# Altium footprint library ICs And Semiconductors SMD.PcbLib: 943 footprints (part 58 of 60)
Each footprint in its own frame and in the unit in brackets; x right, y up, seen from the top. Pads: shape width x height; smd on the part's side, far side on the other; paste and mask are expansions set on the pad; w line width, h text height; cw(c..) or ccw(c..) is an arc to the next point about the centre after c.
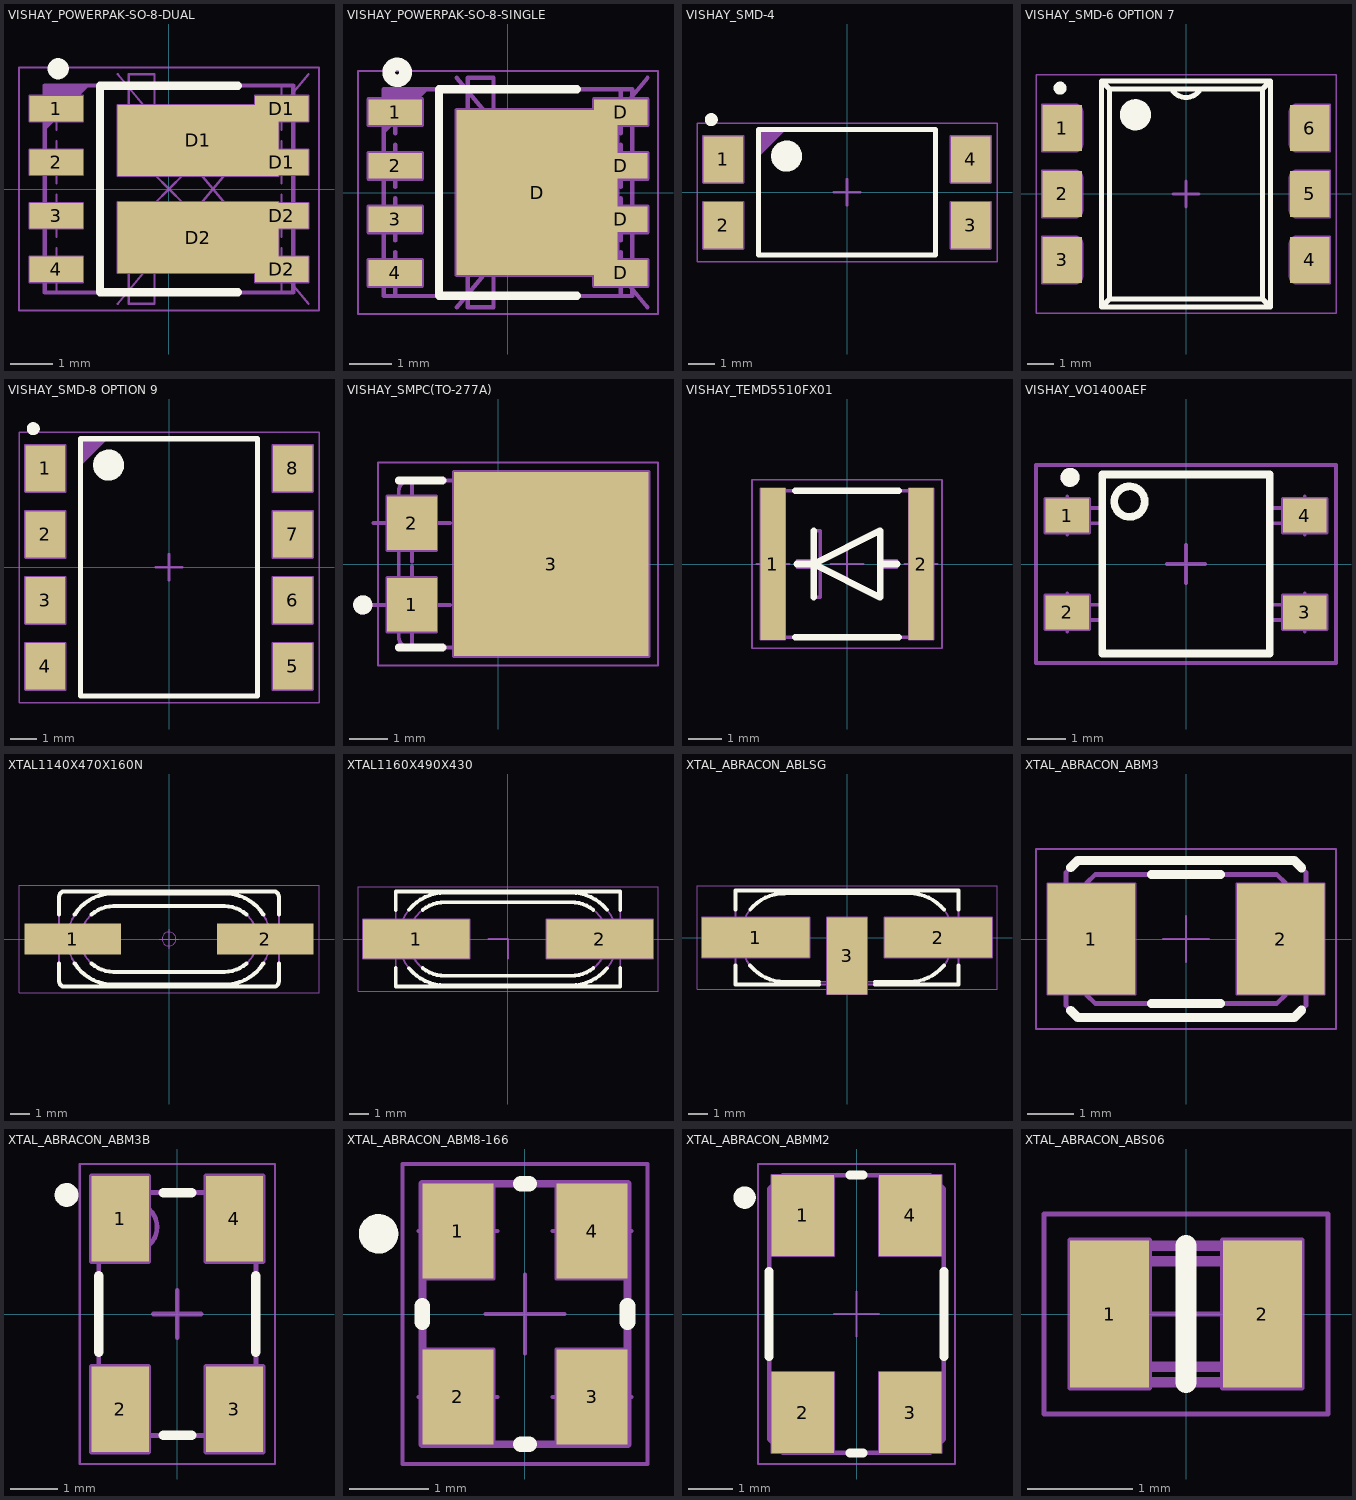
[diagram p57: the footprints below, top view; thin cyan lines are the x and y axes]

## VISHAY_POWERPAK-SO-8-DUAL [mm] "SOIC, 1.27mm Pitch, 8 Pin, Body 5.89mm W X 4.9mm L X 1.12mm H, PowerPAK® SO-8, (DUAL)"
height 1.12
pads (10):
  rect 1.27x0.61 smd: 1(-2.67,1.905) 2(-2.67,0.635) 3(-2.67,-0.635) 4(-2.67,-1.905) D1(2.67,0.635) D1(2.67,1.905) D2(2.67,-1.905) D2(2.67,-0.635)
  rect 3.81x1.68 smd: D1(0.69,1.15) D2(0.69,-1.15)
Top Overlay:
  circle w0.3: c-2.625,2.85 r0.1
  lines w0.2: 1.635,-2.45 -1.635,-2.45 -1.635,2.45 1.635,2.45
Mechanical 8:
  lines w0.05: -3.17,-1.905 -2.67,-1.905 ; -3.17,-0.635 -2.67,-0.635 ; -3.17,0.635 -2.67,0.635 ; -3.17,1.905 -2.67,1.905 ; -2.67,-2.405 -2.67,-1.905 ; -2.67,-1.405 -2.67,-1.905 ; -2.67,-1.135 -2.67,-0.635 ; -2.67,-0.135 -2.67,-0.635 ; -2.67,0.135 -2.67,0.635 ; -2.67,1.135 -2.67,0.635 ; -2.67,1.405 -2.67,1.905 ; -2.67,2.405 -2.67,1.905 ; -2.17,-1.905 -2.67,-1.905 ; -2.17,-0.635 -2.67,-0.635 ; -2.17,0.635 -2.67,0.635 ; -2.17,1.905 -2.67,1.905 ; -1.215,-2.72 1.045,0 ; -1.215,2.72 1.045,0 ; -0.955,-1.955 -0.955,-2.72 -0.345,-2.72 -0.345,-1.955 ; -0.955,1.955 -0.955,2.72 -0.345,2.72 -0.345,1.955 ; -0.354,-0.354 0,0 ; -0.354,0.354 0,0 ; 0.19,-1.15 0.69,-1.15 ; 0.19,1.15 0.69,1.15 ; 0.354,-0.354 0,0 ; 0.354,0.354 0,0 ; 0.69,-1.65 0.69,-1.15 ; 0.69,-0.65 0.69,-1.15 ; 0.69,0.65 0.69,1.15 ; 0.69,1.65 0.69,1.15 ; 1.19,-1.15 0.69,-1.15 ; 1.19,1.15 0.69,1.15 ; 2.17,-1.905 2.67,-1.905 ; 2.17,-0.635 2.67,-0.635 ; 2.17,0.635 2.67,0.635 ; 2.17,1.905 2.67,1.905 ; 2.67,-2.405 2.67,-1.905 ; 2.67,-1.405 2.67,-1.905 ; 2.67,-1.135 2.67,-0.635 ; 2.67,-0.135 2.67,-0.635 ; 2.67,0.135 2.67,0.635 ; 2.67,1.135 2.67,0.635 ; 2.67,1.405 2.67,1.905 ; 2.67,2.405 2.67,1.905 ; 3.17,-1.905 2.67,-1.905 ; 3.17,-0.635 2.67,-0.635 ; 3.17,0.635 2.67,0.635 ; 3.17,1.905 2.67,1.905 ; 3.305,-2.72 1.045,0 ; 3.305,2.72 1.045,0 ; -3.305,-2.21 -3.305,-1.6 -2.035,-1.6 -2.035,-2.21 -3.305,-2.21 ; -3.305,-0.94 -3.305,-0.33 -2.035,-0.33 -2.035,-0.94 -3.305,-0.94 ; -3.305,0.33 -3.305,0.94 -2.035,0.94 -2.035,0.33 -3.305,0.33 ; -3.305,1.6 -3.305,2.21 -2.035,2.21 -2.035,1.6 -3.305,1.6 ; -1.215,-1.99 -1.215,-0.31 2.595,-0.31 2.595,-1.99 -1.215,-1.99 ; -1.215,0.31 -1.215,1.99 2.595,1.99 2.595,0.31 -1.215,0.31 ; 2.035,-2.21 2.035,-1.955 2.035,-1.6 2.595,-1.6 3.305,-1.6 3.305,-2.21 2.035,-2.21 ; 2.035,-0.94 2.035,-0.33 2.595,-0.33 3.305,-0.33 3.305,-0.94 2.595,-0.94 2.035,-0.94 ; 2.035,0.33 2.035,0.94 2.595,0.94 3.305,0.94 3.305,0.33 2.595,0.33 2.035,0.33 ; 2.035,1.6 2.035,1.955 2.035,2.21 3.305,2.21 3.305,1.6 2.595,1.6 2.035,1.6
Mechanical 14:
  lines w0.1: -2.945,1.45 -1.945,2.45 ; -2.945,1.55 -2.045,2.45 ; -2.945,1.65 -2.145,2.45 ; -2.945,1.75 -2.245,2.45 ; -2.945,1.85 -2.345,2.45 ; -2.945,1.95 -2.445,2.45 ; -2.945,2.05 -2.545,2.45 ; -2.945,2.15 -2.645,2.45 ; -2.945,2.25 -2.745,2.45 ; -2.945,2.35 -2.845,2.45 ; -2.945,-2.45 2.945,-2.45 2.945,2.45 -2.945,2.45 -2.945,-2.45
Mechanical 15:
  lines w0.05: -3.555,-2.88 -3.555,2.88 3.555,2.88 3.555,-2.88 -3.555,-2.88
3D body "VISHAY_POWERPAK-SO-8-DUAL.stp": height 1.12, standoff 0, extent -3.125,-2.54 3.125,2.54

## VISHAY_POWERPAK-SO-8-SINGLE [mm] "SOIC, 1.27mm Pitch, 8 Pin, Body 5.89mm W X 4.9mm L X 1.12mm H, PowerPAK® SO-8, (SINGLE)"
height 1.12
pads (9):
  rect 1.27x0.61 smd: 1(-2.67,1.905) 2(-2.67,0.635) 3(-2.67,-0.635) 4(-2.67,-1.905) D(2.67,-1.905) D(2.67,-0.635) D(2.67,0.635) D(2.67,1.905)
  rect 3.81x3.91 smd: D(0.69,0)
Top Overlay:
  circle w0.3: c-2.625,2.85 r0.2
  lines w0.2: 1.635,-2.45 -1.635,-2.45 -1.635,2.45 1.635,2.45
Mechanical 8:
  lines w0.1: -3.17,-1.905 -2.67,-1.905 ; -3.17,-0.635 -2.67,-0.635 ; -3.17,0.635 -2.67,0.635 ; -3.17,1.905 -2.67,1.905 ; -2.67,-2.405 -2.67,-1.905 ; -2.67,-1.405 -2.67,-1.905 ; -2.67,-1.135 -2.67,-0.635 ; -2.67,-0.135 -2.67,-0.635 ; -2.67,0.135 -2.67,0.635 ; -2.67,1.135 -2.67,0.635 ; -2.67,1.405 -2.67,1.905 ; -2.67,2.405 -2.67,1.905 ; -2.17,-1.905 -2.67,-1.905 ; -2.17,-0.635 -2.67,-0.635 ; -2.17,0.635 -2.67,0.635 ; -2.17,1.905 -2.67,1.905 ; -1.215,-2.72 1.045,0 ; -1.215,2.72 1.045,0 ; -0.354,-0.354 0,0 ; -0.354,0.354 0,0 ; 0.19,0 0.69,0 ; 0.354,-0.354 0,0 ; 0.354,0.354 0,0 ; 0.69,-0.5 0.69,0 ; 0.69,0.5 0.69,0 ; 1.19,0 0.69,0 ; 2.17,-1.905 2.67,-1.905 ; 2.17,-0.635 2.67,-0.635 ; 2.17,0.635 2.67,0.635 ; 2.17,1.905 2.67,1.905 ; 2.67,-2.405 2.67,-1.905 ; 2.67,-1.405 2.67,-1.905 ; 2.67,-1.135 2.67,-0.635 ; 2.67,-0.135 2.67,-0.635 ; 2.67,0.135 2.67,0.635 ; 2.67,1.135 2.67,0.635 ; 2.67,1.405 2.67,1.905 ; 2.67,2.405 2.67,1.905 ; 3.17,-1.905 2.67,-1.905 ; 3.17,-0.635 2.67,-0.635 ; 3.17,0.635 2.67,0.635 ; 3.17,1.905 2.67,1.905 ; 3.305,-2.72 1.045,0 ; 3.305,2.72 1.045,0 ; -1.215,-1.955 -1.215,1.955 ; -1.215,-1.955 -0.955,-1.955 -0.955,-2.72 -0.345,-2.72 -0.345,-1.955 2.035,-1.955 ; -1.215,-1.955 2.595,-1.955 ; -1.215,1.955 -0.955,1.955 -0.955,2.72 -0.345,2.72 -0.345,1.955 2.035,1.955 ; -1.215,1.955 2.595,1.955 ; 2.035,-1.955 2.035,-2.21 3.305,-2.21 3.305,-1.6 2.595,-1.6 ; 2.035,-1.955 2.595,-1.955 ; 2.035,-1.955 2.035,-1.6 2.595,-1.6 ; 2.035,1.955 2.035,2.21 3.305,2.21 3.305,1.6 2.595,1.6 ; 2.035,1.955 2.595,1.955 ; 2.035,1.955 2.035,1.6 2.595,1.6 ; 2.595,-1.955 2.595,-1.6 ; 2.595,-1.6 2.595,-0.94 ; 2.595,-0.94 3.305,-0.94 3.305,-0.33 2.595,-0.33 ; 2.595,-0.94 2.035,-0.94 2.035,-0.33 2.595,-0.33 ; 2.595,-0.94 2.595,-0.33 ; 2.595,-0.33 2.595,0.33 ; 2.595,0.33 3.305,0.33 3.305,0.94 2.595,0.94 ; 2.595,0.33 2.035,0.33 2.035,0.94 2.595,0.94 ; 2.595,0.33 2.595,0.94 ; 2.595,0.94 2.595,1.6 ; 2.595,1.6 2.595,1.955 ; -3.305,-2.21 -3.305,-1.6 -2.035,-1.6 -2.035,-2.21 -3.305,-2.21 ; -3.305,-0.94 -3.305,-0.33 -2.035,-0.33 -2.035,-0.94 -3.305,-0.94 ; -3.305,0.33 -3.305,0.94 -2.035,0.94 -2.035,0.33 -3.305,0.33 ; -3.305,1.6 -3.305,2.21 -2.035,2.21 -2.035,1.6 -3.305,1.6
Mechanical 14:
  lines w0.1: -2.945,1.45 -1.945,2.45 ; -2.945,1.55 -2.045,2.45 ; -2.945,1.65 -2.145,2.45 ; -2.945,1.75 -2.245,2.45 ; -2.945,1.85 -2.345,2.45 ; -2.945,1.95 -2.445,2.45 ; -2.945,2.05 -2.545,2.45 ; -2.945,2.15 -2.645,2.45 ; -2.945,2.25 -2.745,2.45 ; -2.945,2.35 -2.845,2.45 ; -2.945,-2.45 2.945,-2.45 2.945,2.45 -2.945,2.45 -2.945,-2.45
Mechanical 15:
  lines w0.05: -3.555,-2.88 -3.555,2.88 3.555,2.88 3.555,-2.88 -3.555,-2.88
3D body "VISHAY_POWERPAK-SO-8-SINGLE.stp": height 1.12, standoff 0, extent -3.125,-2.54 3.125,2.54

## VISHAY_SMD-4 [mm] "VISHAY SMD-4 Package"
height 3.9
pads (4):
  rect 1.52x1.78 smd: 1(-4.765,1.27) 2(-4.765,-1.27) 3(4.765,-1.27) 4(4.765,1.27)
Top Overlay:
  circle w0.25: c-5.225,2.8 r0.125
  circle w0.6: c-2.325,1.4 r0.3
  lines w0.2: -3.405,-2.415 3.405,-2.415 3.405,2.415 -3.405,2.415 -3.405,-2.415
Mechanical 8:
  lines w0.1: -5.265,-1.27 -4.765,-1.27 ; -5.265,1.27 -4.765,1.27 ; -4.765,-1.77 -4.765,-1.27 ; -4.765,-0.77 -4.765,-1.27 ; -4.765,0.77 -4.765,1.27 ; -4.765,1.77 -4.765,1.27 ; -4.265,-1.27 -4.765,-1.27 ; -4.265,1.27 -4.765,1.27 ; -0.5,0 0,0 ; 0,-0.5 0,0 ; 0,0.5 0,0 ; 0.5,0 0,0 ; 4.265,-1.27 4.765,-1.27 ; 4.265,1.27 4.765,1.27 ; 4.765,-1.77 4.765,-1.27 ; 4.765,-0.77 4.765,-1.27 ; 4.765,0.77 4.765,1.27 ; 4.765,1.77 4.765,1.27 ; 5.265,-1.27 4.765,-1.27 ; 5.265,1.27 4.765,1.27 ; -5.525,-2.16 -5.525,-0.38 -4.005,-0.38 -4.005,-2.16 -5.525,-2.16 ; -5.525,0.38 -5.525,2.16 -4.005,2.16 -4.005,0.38 -5.525,0.38 ; 4.005,-2.16 4.005,-0.38 5.525,-0.38 5.525,-2.16 4.005,-2.16 ; 4.005,0.38 4.005,2.16 5.525,2.16 5.525,0.38 4.005,0.38
Mechanical 14:
  lines w0.1: -3.405,1.415 -2.405,2.415 ; -3.405,1.515 -2.505,2.415 ; -3.405,1.615 -2.605,2.415 ; -3.405,1.715 -2.705,2.415 ; -3.405,1.815 -2.805,2.415 ; -3.405,1.915 -2.905,2.415 ; -3.405,2.015 -3.005,2.415 ; -3.405,2.115 -3.105,2.415 ; -3.405,2.215 -3.205,2.415 ; -3.405,2.315 -3.305,2.415 ; -3.405,-2.415 3.405,-2.415 3.405,2.415 -3.405,2.415 -3.405,-2.415
Mechanical 15:
  lines w0.05: -5.775,-2.665 -5.775,2.665 5.775,2.665 5.775,-2.665 -5.775,-2.665
3D body "VISHAY_SMD-4.stp": height 3.9, standoff 0, extent -5.1,-2.415 5.1,2.415

## VISHAY_SMD-6 OPTION 7 [mm] "VISHAY SMD 6 Option 7, Pitch 2.54mm Package, Body 6.4mm x 8.6mm"
height 4.6
pads (6):
  rect 1.52x1.78 smd: 1(-4.765,2.54) 2(-4.765,0) 3(-4.765,-2.54) 4(4.765,-2.54) 5(4.765,0) 6(4.765,2.54)
Top Overlay:
  circle w0.6: c-1.95,3.05 r0.3
  circle w0.25: c-4.85,4.075 r0.125
  lines w0.2: -0.554,4.04 ccw(c0,4.35) 0.554,4.04 ; 2.941,4.04 2.941,-4.041 ; -3.25,-4.35 -2.941,-4.041 ; -3.25,-4.35 -3.25,4.35 ; -3.25,-4.35 3.25,-4.35 ; -3.25,4.35 -2.941,4.04 ; -3.25,4.35 3.25,4.35 ; -2.941,-4.041 -2.941,4.04 ; -2.941,-4.041 2.941,-4.041 ; -2.941,4.04 2.941,4.041 3.25,4.35 ; 2.941,-4.041 3.25,-4.35 ; 3.25,-4.35 3.25,4.35
Mechanical 8:
  lines w0.1: -5.265,-2.54 -4.765,-2.54 ; -5.265,0 -4.765,0 ; -5.265,2.54 -4.765,2.54 ; -4.765,-3.04 -4.765,-2.54 ; -4.765,-2.04 -4.765,-2.54 ; -4.765,-0.5 -4.765,0 ; -4.765,0.5 -4.765,0 ; -4.765,2.04 -4.765,2.54 ; -4.765,3.04 -4.765,2.54 ; -4.265,-2.54 -4.765,-2.54 ; -4.265,0 -4.765,0 ; -4.265,2.54 -4.765,2.54 ; -0.5,0 0,0 ; 0,-0.5 0,0 ; 0,0.5 0,0 ; 0.5,0 0,0 ; 4.265,-2.54 4.765,-2.54 ; 4.265,0 4.765,0 ; 4.265,2.54 4.765,2.54 ; 4.765,-3.04 4.765,-2.54 ; 4.765,-2.04 4.765,-2.54 ; 4.765,-0.5 4.765,0 ; 4.765,0.5 4.765,0 ; 4.765,2.04 4.765,2.54 ; 4.765,3.04 4.765,2.54 ; 5.265,-2.54 4.765,-2.54 ; 5.265,0 4.765,0 ; 5.265,2.54 4.765,2.54 ; -5.525,-3.43 -5.525,-1.65 -4.255,-1.65 cw(c-4.255,-1.9) -4.005,-1.9 -4.005,-3.18 cw(c-4.255,-3.18) -4.255,-3.43 -5.525,-3.43 ; -5.525,-0.89 -5.525,0.89 -4.255,0.89 cw(c-4.255,0.64) -4.005,0.64 -4.005,-0.64 cw(c-4.255,-0.64) -4.255,-0.89 -5.525,-0.89 ; -5.525,1.65 -5.525,3.43 -4.255,3.43 cw(c-4.255,3.18) -4.005,3.18 -4.005,1.9 cw(c-4.255,1.9) -4.255,1.65 -5.525,1.65 ; 4.005,-3.18 ccw(c4.255,-3.18) 4.255,-3.43 5.525,-3.43 5.525,-1.65 4.255,-1.65 ccw(c4.255,-1.9) 4.005,-1.9 4.005,-3.18 ; 4.005,-0.64 ccw(c4.255,-0.64) 4.255,-0.89 5.525,-0.89 5.525,0.89 4.255,0.89 ccw(c4.255,0.64) 4.005,0.64 4.005,-0.64 ; 4.005,1.9 ccw(c4.255,1.9) 4.255,1.65 5.525,1.65 5.525,3.43 4.255,3.43 ccw(c4.255,3.18) 4.005,3.18 4.005,1.9
Mechanical 14:
  lines w0.1: -0.554,4.04 ccw(c0,4.35) 0.554,4.04 ; 2.941,4.04 2.941,-4.041 ; -3.25,-4.35 -2.941,-4.041 ; -3.25,-4.35 -3.25,4.35 ; -3.25,-4.35 3.25,-4.35 ; -3.25,4.35 -2.941,4.04 ; -3.25,4.35 3.25,4.35 ; -2.941,-4.041 -2.941,4.04 ; -2.941,-4.041 2.941,-4.041 ; -2.941,4.04 2.941,4.041 3.25,4.35 ; 2.941,-4.041 3.25,-4.35 ; 3.25,-4.35 3.25,4.35
Mechanical 15:
  lines w0.05: -5.775,-4.6 5.775,-4.6 5.775,4.6 -5.775,4.6 -5.775,-4.6
3D body "VISHAY_SMD-6 OPTION 7.stp": height 4.6, standoff 0, extent -5.15,-4.35 5.15,4.35

## VISHAY_SMD-8 OPTION 9 [mm] "SOIC, 2.54mm Pitch, 8 Pin, Body 6.64mm W X 9.77mm L X 4.059mm H, VISHAY SMD-8 Option 9"
height 4.059
pads (8):
  rect 1.52x1.78 smd: 1(-4.763,3.81) 2(-4.763,1.27) 3(-4.763,-1.27) 4(-4.763,-3.81) 5(4.763,-3.81) 6(4.763,-1.27) 7(4.763,1.27) 8(4.763,3.81)
Top Overlay:
  circle w0.25: c-5.225,5.34 r0.125
  circle w0.6: c-2.325,3.94 r0.3
  lines w0.2: -3.405,-4.955 -3.405,4.955 3.405,4.955 3.405,-4.955 -3.405,-4.955
Mechanical 8:
  lines w0.1: -5.263,-3.81 -4.763,-3.81 ; -5.263,-1.27 -4.763,-1.27 ; -5.263,1.27 -4.763,1.27 ; -5.263,3.81 -4.763,3.81 ; -4.763,-4.31 -4.763,-3.81 ; -4.763,-3.31 -4.763,-3.81 ; -4.763,-1.77 -4.763,-1.27 ; -4.763,-0.77 -4.763,-1.27 ; -4.763,0.77 -4.763,1.27 ; -4.763,1.77 -4.763,1.27 ; -4.763,3.31 -4.763,3.81 ; -4.763,4.31 -4.763,3.81 ; -4.263,-3.81 -4.763,-3.81 ; -4.263,-1.27 -4.763,-1.27 ; -4.263,1.27 -4.763,1.27 ; -4.263,3.81 -4.763,3.81 ; -0.5,0 0,0 ; 0,-0.5 0,0 ; 0,0.5 0,0 ; 0.5,0 0,0 ; 4.263,-3.81 4.763,-3.81 ; 4.263,-1.27 4.763,-1.27 ; 4.263,1.27 4.763,1.27 ; 4.263,3.81 4.763,3.81 ; 4.763,-4.31 4.763,-3.81 ; 4.763,-3.31 4.763,-3.81 ; 4.763,-1.77 4.763,-1.27 ; 4.763,-0.77 4.763,-1.27 ; 4.763,0.77 4.763,1.27 ; 4.763,1.77 4.763,1.27 ; 4.763,3.31 4.763,3.81 ; 4.763,4.31 4.763,3.81 ; 5.263,-3.81 4.763,-3.81 ; 5.263,-1.27 4.763,-1.27 ; 5.263,1.27 4.763,1.27 ; 5.263,3.81 4.763,3.81 ; -5.525,-4.7 -5.525,-2.92 -4,-2.92 -4,-4.7 -5.525,-4.7 ; -5.525,-2.16 -5.525,-0.38 -4,-0.38 -4,-2.16 -5.525,-2.16 ; -5.525,0.38 -5.525,2.16 -4,2.16 -4,0.38 -5.525,0.38 ; -5.525,2.92 -4,2.92 -4,4.7 -5.525,4.7 -5.525,2.92 ; 4,-4.7 5.525,-4.7 5.525,-2.92 4,-2.92 4,-4.7 ; 4,-2.16 5.525,-2.16 5.525,-0.38 4,-0.38 4,-2.16 ; 4,0.38 5.525,0.38 5.525,2.16 4,2.16 4,0.38 ; 4,2.92 5.525,2.92 5.525,4.7 4,4.7 4,2.92
Mechanical 14:
  lines w0.1: -3.405,3.955 -2.405,4.955 ; -3.405,4.055 -2.505,4.955 ; -3.405,4.155 -2.605,4.955 ; -3.405,4.255 -2.705,4.955 ; -3.405,4.355 -2.805,4.955 ; -3.405,4.455 -2.905,4.955 ; -3.405,4.555 -3.005,4.955 ; -3.405,4.655 -3.105,4.955 ; -3.405,4.755 -3.205,4.955 ; -3.405,4.855 -3.305,4.955 ; -3.405,-4.955 -3.405,4.955 3.405,4.955 3.405,-4.955 -3.405,-4.955
Mechanical 15:
  lines w0.05: -5.775,-5.205 -5.775,5.205 5.775,5.205 5.775,-5.205 -5.775,-5.205
3D body "VISHAY_SMD-8 OPTION 9.stp": height 4.06, standoff 0, extent -5.015,-4.955 5.015,4.955

## VISHAY_SMPC(TO-277A) [mm] "TO-277A (SMPC), 3-Leads, Pitch 2.13mm, Body 6.1x4.3mm"
height 1.2
pads (3):
  rect 1.3x1.4 smd: 1(-2.247,-1.065) 2(-2.247,1.065)
  rect 5.07x4.8 smd: 3(1.383,0)
Top Overlay:
  circle w0.25: c-3.529,-1.067 r0.125
  lines w0.2: -2.593,-2.175 -1.452,-2.175 ; -2.593,2.175 -1.452,2.175
Mechanical 8:
  lines w0.1: -3.247,-1.065 -2.247,-1.065 ; -3.247,1.065 -2.247,1.065 ; -2.247,-2.065 -2.247,-1.065 ; -2.247,-0.065 -2.247,-1.065 ; -2.247,0.065 -2.247,1.065 ; -2.247,2.065 -2.247,1.065 ; -1.247,-1.065 -2.247,-1.065 ; -1.247,1.065 -2.247,1.065 ; -1,0 0,0 ; 0,-1 0,0 ; 0,1 0,0 ; 0.383,0 1.383,0 ; 1,0 0,0 ; 1.383,-1 1.383,0 ; 1.383,1 1.383,0 ; 2.383,0 1.383,0 ; -2.882,-1.765 -1.612,-1.765 -1.612,-0.365 -2.882,-0.365 -2.882,-1.765 ; -2.882,0.365 -1.612,0.365 -1.612,1.765 -2.882,1.765 -2.882,0.365 ; -1.152,-2.4 -1.152,2.4 3.918,2.4 3.918,-2.4 -1.152,-2.4
Mechanical 14:
  circle w0.25: c-3.529,-1.067 r0.125
  lines w0.1: -2.593,-1.74 -2.843,-1.74 -2.843,-0.39 -2.593,-0.39 ; -2.593,0.39 -2.843,0.39 -2.843,1.74 -2.593,1.74 ; -0.993,-2.175 -0.993,-2.375 -0.243,-2.375 -0.243,-2.175 ; -0.993,2.175 -0.993,2.375 -0.243,2.375 -0.243,2.175 ; 3.557,-1.1 3.807,-1.1 3.807,1.1 3.557,1.1 ; -2.593,-1.9 ccw(c-2.318,-1.9) -2.318,-2.175 3.282,-2.175 ccw(c3.282,-1.9) 3.557,-1.9 3.557,1.9 ccw(c3.282,1.9) 3.282,2.175 -2.318,2.175 ccw(c-2.318,1.9) -2.593,1.9 -2.593,-1.9
Mechanical 15:
  lines w0.05: -3.132,-2.65 4.168,-2.65 4.168,2.65 -3.132,2.65 -3.132,-2.65
3D body "VISHAY_SMPC(TO-277A).stp": height 1.2, standoff 0, extent -2.843,-2.375 3.807,2.375

## VISHAY_TEMD5510FX01 [mm] "SMD Ambient Light Sensor L 5mm x W 4.24 x H 1.12"
height 1.12
pads (2):
  rect 0.75x4.55 smd: 1(-2.225,0) 2(2.225,0)
Top Overlay:
  lines w0.2: -1.55,-2.195 1.55,-2.195 ; -1.55,2.195 1.55,2.195 ; -1.5,0 -1,0 ; -1,-1 -1,1 ; 1,0 1.5,0 ; -1,0 1,1 1,-1 -1,0
Mechanical 8:
  lines w0.05: -2.725,0 -2.225,0 ; -2.225,-0.5 -2.225,0 ; -2.225,0.5 -2.225,0 ; -1.725,0 -2.225,0 ; -0.5,0 0,0 ; 0,-0.5 0,0 ; 0,0.5 0,0 ; 0.5,0 0,0 ; 1.725,0 2.225,0 ; 2.225,-0.5 2.225,0 ; 2.225,0.5 2.225,0 ; 2.725,0 2.225,0 ; -2.6,-2.275 -1.85,-2.275 -1.85,2.275 -2.6,2.275 -2.6,-2.275 ; 1.85,-2.275 2.6,-2.275 2.6,2.275 1.85,2.275 1.85,-2.275
Mechanical 14:
  lines w0.1: -2.275,-2.195 -2.275,2.195 ; 2.275,-2.195 2.275,2.195 ; -2.575,-2.195 -2.575,2.195 2.575,2.195 2.575,-2.195 -2.575,-2.195 ; -1.5,-0.1 -1.5,0.1 -1,0.1 -1,1 -0.8,1 -0.8,0.1 1,1 1,0.1 1.5,0.1 1.5,-0.1 1,-0.1 1,-1 -0.8,-0.1 -0.8,-1 -1,-1 -1,-0.1 -1.5,-0.1
Mechanical 15:
  lines w0.05: -2.85,-2.525 2.85,-2.525 2.85,2.525 -2.85,2.525 -2.85,-2.525
3D body "VISHAY_TEMD5510FX01.stp": height 1.12, standoff 0, extent -2.575,-2.195 2.575,2.195

## VISHAY_VO1400AEF [mm] "VISHAY SOIC 4 Pin Package, Body 4.39mm x 4.7mm"
height 2.34
pads (4):
  rect 1.14x0.89 smd: 1(-3.12,1.27) 2(-3.12,-1.27) 3(3.12,-1.27) 4(3.12,1.27)
Top Overlay:
  circle w0.25: c-3.047,2.277 r0.125
  circle w0.2: c-1.484,1.639 r0.4
  lines w0.2: -2.195,-2.35 -2.195,2.35 2.195,2.35 2.195,-2.35 -2.195,-2.35
Mechanical 8:
  lines w0.1: -3.62,-1.27 -3.12,-1.27 ; -3.62,1.27 -3.12,1.27 ; -3.12,-1.77 -3.12,-1.27 ; -3.12,-0.77 -3.12,-1.27 ; -3.12,0.77 -3.12,1.27 ; -3.12,1.77 -3.12,1.27 ; -2.62,-1.27 -3.12,-1.27 ; -2.62,1.27 -3.12,1.27 ; -0.5,0 0,0 ; 0,-0.5 0,0 ; 0,0.5 0,0 ; 0.5,0 0,0 ; 2.62,-1.27 3.12,-1.27 ; 2.62,1.27 3.12,1.27 ; 3.12,-1.77 3.12,-1.27 ; 3.12,-0.77 3.12,-1.27 ; 3.12,0.77 3.12,1.27 ; 3.12,1.77 3.12,1.27 ; 3.62,-1.27 3.12,-1.27 ; 3.62,1.27 3.12,1.27 ; -3.69,-1.715 -3.69,-0.825 -2.55,-0.825 -2.55,-1.715 -3.69,-1.715 ; -3.69,0.825 -3.69,1.715 -2.55,1.715 -2.55,0.825 -3.69,0.825 ; 2.55,-1.715 2.55,-0.825 3.69,-0.825 3.69,-1.715 2.55,-1.715 ; 2.55,0.825 2.55,1.715 3.69,1.715 3.69,0.825 2.55,0.825
Mechanical 14:
  circle w0.1: c-1.484,1.639 r0.4
  circle w0.25: c-3.047,2.277 r0.125
  circle w0.1: c-1.484,1.639 r0.4
  lines w0.1: -2.195,-1.47 -3.4,-1.47 -3.4,-1.07 -2.195,-1.07 ; -2.195,1.07 -3.4,1.07 -3.4,1.47 -2.195,1.47 ; 2.195,-1.47 3.4,-1.47 3.4,-1.07 2.195,-1.07 ; 2.195,1.07 3.4,1.07 3.4,1.47 2.195,1.47 ; -2.195,-2.35 -2.195,2.35 2.195,2.35 2.195,-2.35 -2.195,-2.35
Mechanical 15:
  lines w0.1: -3.94,-2.6 -3.94,2.6 3.94,2.6 3.94,-2.6 -3.94,-2.6
3D body "VISHAY_VO1400AEF.stp": height 2.34, standoff 0, extent -3.4,-2.35 3.4,2.35

## XTAL1140X470X160N [mm] "HC/49US Crystal;11.40mm L X 4.70mm W X 1.60mm H"
height 1.6
pads (2):
  rect 4.85x1.55 smd: 1(-4.85,0) 2(4.85,0)
Top Overlay:
  lines w0.2: -5.525,-1.225 -5.525,-2.15 ccw(c-5.275,-2.15) -5.275,-2.4 5.275,-2.4 ccw(c5.275,-2.15) 5.525,-2.15 5.525,-1.225 ; -5.525,1.225 -5.525,2.15 cw(c-5.275,2.15) -5.275,2.4 5.275,2.4 cw(c5.275,2.15) 5.525,2.15 5.525,1.225 ; -4.747,-1.225 ccw(c-2.8,0) -2.8,-2.3 2.8,-2.3 ccw(c2.8,0) 4.747,-1.225 ; -4.747,1.225 cw(c-2.8,0) -2.8,2.3 2.8,2.3 cw(c2.8,0) 4.747,1.225 ; -3.905,-1.225 ccw(c-2.8,0) -2.8,-1.65 2.8,-1.65 ccw(c2.8,0) 3.905,-1.225 ; -3.905,1.225 cw(c-2.8,0) -2.8,1.65 2.8,1.65 cw(c2.8,0) 3.905,1.225
Mechanical 14:
  lines w0.1: -5.525,-2.15 ccw(c-5.275,-2.15) -5.275,-2.4 5.275,-2.4 ccw(c5.275,-2.15) 5.525,-2.15 5.525,2.15 ccw(c5.275,2.15) 5.275,2.4 -5.275,2.4 ccw(c-5.275,2.15) -5.525,2.15 -5.525,-2.15 ; -2.8,-2.3 cw(c-2.8,0) -2.8,2.3 2.8,2.3 cw(c2.8,0) 2.8,-2.3 -2.8,-2.3 ; -2.8,-1.65 cw(c-2.8,0) -2.8,1.65 2.8,1.65 cw(c2.8,0) 2.8,-1.65 -2.8,-1.65
Mechanical 15:
  circle w0.05: c0,0 r0.35
  lines w0.05: -0.5,0 0.5,0 ; 0,-0.5 0,0.5 ; -7.55,-2.7 -7.55,2.7 7.55,2.7 7.55,-2.7 -7.55,-2.7
3D body "XTAL1105X470X160N.stp": height 1.6, standoff 0, extent -6.35,-2.4 6.35,2.4

## XTAL1160X490X430 [mm] "HC49/4H SMX Case, SMD Cristal, Body 11.6x4.9mm"
height 4.3
pads (2):
  rect 5.5x2 smd: 1(-4.75,0) 2(4.75,0)
Top Overlay:
  lines w0.2: -5.8,-1.5 -5.8,-2.45 5.8,-2.45 5.8,-1.5 ; -5.8,1.5 -5.8,2.45 5.8,2.45 5.8,1.5 ; -5.114,-1.512 ccw(c-3.25,0) -3.25,-2.4 3.25,-2.4 ccw(c3.25,0) 5.114,-1.512 ; -5.114,1.512 cw(c-3.25,0) -3.25,2.4 3.25,2.4 cw(c3.25,0) 5.114,1.512 ; -4.406,-1.508 ccw(c-3.25,0) -3.25,-1.9 3.25,-1.9 ccw(c3.25,0) 4.406,-1.508 ; -4.406,1.508 cw(c-3.25,0) -3.25,1.9 ; -3.211,1.9 3.25,1.9 cw(c3.25,0) 4.406,1.508
Mechanical 8:
  lines w0.1: -5.75,0 -4.75,0 -4.75,-1 ; -1,0 0,0 0,-1 ; 3.75,0 4.75,0 4.75,-1 ; -7.5,-1 -7.5,1 -2,1 -2,-1 -7.5,-1 ; 2,-1 7.5,-1 7.5,1 2,1 2,-1
Mechanical 14:
  lines w0.1: -5.8,-0.3 -6.7,-0.3 -6.7,0.3 -5.8,0.3 ; -5.15,0 ccw(c-3.25,0) -3.25,-1.9 ; 5.15,0 cw(c3.25,0) 3.25,-1.9 ; 5.8,-0.3 6.7,-0.3 6.7,0.3 5.8,0.3 ; -3.25,-1.9 cw(c-3.25,0) -3.25,1.9 3.25,1.9 cw(c3.25,0) 3.25,-1.9 ; -3.25,-1.9 3.25,-1.9 ; -5.8,-2.45 -5.8,2.45 5.8,2.45 5.8,-2.45 -5.8,-2.45 ; -3.25,-2.4 cw(c-3.25,0) -3.25,2.4 3.25,2.4 cw(c3.25,0) 3.25,-2.4 -3.25,-2.4
Mechanical 15:
  lines w0.05: -7.75,-2.7 -7.75,2.7 7.75,2.7 7.75,-2.7 -7.75,-2.7
3D body "XTAL_1160X490X430.stp": height 4.3, standoff 0, extent -7.15,-2.45 7.15,2.45

## XTAL_ABRACON_ABLSG [mm] "HC/49US (AT49) SMD Cristal, Body 11.4x4.7mm, ABLSG Serie"
height 4.3
pads (3):
  rect 5.6x2.1 smd: 1(-4.75,0) 2(4.75,0)
  rect 2.1x4 smd: 3(0,-0.95)
Top Overlay:
  lines w0.2: -5.8,-1.45 -5.8,-2.45 -1.45,-2.45 ; -5.8,1.45 -5.8,2.45 5.8,2.45 5.8,1.45 ; -5.036,-1.45 ccw(c-3.25,0) -3.25,-2.3 -1.45,-2.3 ; -5.035,1.45 cw(c-3.25,0) -3.25,2.299 ; -3.25,2.3 3.25,2.3 cw(c3.25,0) 5.035,1.45 ; 1.45,-2.45 5.8,-2.45 5.8,-1.45 ; 1.45,-2.3 3.25,-2.3 ccw(c3.25,0) 5.035,-1.45
Mechanical 8:
  lines w0.1: -5.75,0 -4.75,0 ; -5.25,0 -4.75,0 ; -4.75,-1 -4.75,0 ; -4.75,-0.5 -4.75,0 ; -4.75,0.5 -4.75,0 ; -4.75,1 -4.75,0 ; -4.25,0 -4.75,0 ; -3.75,0 -4.75,0 ; -1,-0.95 0,-0.95 ; -1,0 0,0 ; 0,-1.95 0,-0.95 ; 0,1 0,0 ; 1,-0.95 0,-0.95 ; 1,0 0,0 ; 3.75,0 4.75,0 ; 4.25,0 4.75,0 ; 4.75,-1 4.75,0 ; 4.75,-0.5 4.75,0 ; 4.75,0.5 4.75,0 ; 4.75,1 4.75,0 ; 5.25,0 4.75,0 ; 5.75,0 4.75,0 ; -7.55,-1.05 -7.55,1.05 -1.95,1.05 -1.95,-1.05 -7.55,-1.05 ; -1.05,-2.95 -1.05,1.05 1.05,1.05 1.05,-2.95 -1.05,-2.95 ; 1.95,-1.05 1.95,1.05 7.55,1.05 7.55,-1.05 1.95,-1.05
Mechanical 14:
  lines w0.1: -5.8,-0.3 -6.6,-0.3 -6.6,0.3 -5.8,0.3 ; -3.25,2.299 ccw(c-3.25,0) -3.25,-2.3 3.25,-2.3 ccw(c3.25,0) 3.25,2.3 -3.25,2.3 ; -0.3,-2.45 -0.3,-2.9 0.3,-2.9 0.3,-2.45 ; 5.8,-0.3 6.6,-0.3 6.6,0.3 5.8,0.3 ; -5.8,-2.45 -5.8,2.45 5.8,2.45 5.8,-2.45 -5.8,-2.45
Mechanical 15:
  lines w0.05: -7.8,-2.7 7.8,-2.7 7.8,2.7 -7.8,2.7 -7.8,-2.7
3D body "XTAL_ABRACON_ABLSG.stp": height 4.2, standoff 0, extent -6.6,-2.9 6.6,2.45

## XTAL_ABRACON_ABM3 [mm] "ABM3 Serie, SMD Crystal, Body 5x3.2mm"
height 1.3
pads (2):
  rect 1.9x2.4 smd: 1(-2.052,0) 2(2.048,0)
Top Overlay:
  lines w0.2: -2.498,-1.55 -2.348,-1.7 2.344,-1.7 2.502,-1.542 ; -2.498,1.55 -2.348,1.7 2.344,1.7 2.502,1.542 ; -0.752,-1.397 0.748,-1.397 ; -0.752,1.397 0.748,1.397
Mechanical 8:
  lines w0.05: -2.552,0 -1.552,0 ; -2.052,-0.5 -2.052,0.5 ; -0.502,0 0.498,0 ; -0.002,-0.5 -0.002,0.5 ; 1.548,0 2.548,0 ; 2.048,-0.5 2.048,0.5 ; -3.002,-1.2 -1.102,-1.2 -1.102,1.2 -3.002,1.2 -3.002,-1.2 ; 1.098,-1.2 2.998,-1.2 2.998,1.2 1.098,1.2 1.098,-1.2
Mechanical 14:
  lines w0.1: -2.602,-1.446 -2.348,-1.7 2.344,-1.7 2.598,-1.446 2.598,-0.4 2.395,-0.4 2.395,0.4 2.598,0.4 2.598,1.446 2.344,1.7 -2.348,1.7 -2.602,1.446 -2.602,0.4 -2.399,0.4 -2.399,-0.4 -2.602,-0.4 -2.602,-1.446 ; -2.161,-1.206 -1.97,-1.397 1.967,-1.397 2.157,-1.206 2.157,1.206 1.967,1.397 -1.97,1.397 -2.161,1.206 -2.161,-1.206
Mechanical 15:
  lines w0.05: -3.252,-1.95 -3.252,1.95 3.248,1.95 3.248,-1.95 -3.252,-1.95
3D body "XTAL_ABRACON_ABM3.stp": height 1.3, standoff 0, extent -2.602,-1.7 2.598,1.7

## XTAL_ABRACON_ABM3B [mm] "ABM3B Serie, SMD Cristal, Body 5.x3.2mm"
height 1.1
pads (4):
  rect 1.2x1.8 smd: 1(-1.2,2) 2(-1.2,-2) 3(1.2,-2) 4(1.2,2)
Top Overlay:
  circle w0.25: c-2.325,2.5 r0.125
  lines w0.2: -1.65,-0.8 -1.65,0.8 ; -0.3,-2.55 0.3,-2.55 ; -0.3,2.55 0.3,2.55 ; 1.65,-0.8 1.65,0.8
Mechanical 8:
  lines w0.1: -1.7,-2 -1.2,-2 ; -1.7,2 -1.2,2 ; -1.2,-2.5 -1.2,-2 ; -1.2,-1.5 -1.2,-2 ; -1.2,1.5 -1.2,2 ; -1.2,2.5 -1.2,2 ; -0.7,-2 -1.2,-2 ; -0.7,2 -1.2,2 ; -0.5,0 0,0 ; 0,-0.5 0,0 ; 0,0.5 0,0 ; 0.5,0 0,0 ; 0.7,-2 1.2,-2 ; 0.7,2 1.2,2 ; 1.2,-2.5 1.2,-2 ; 1.2,-1.5 1.2,-2 ; 1.2,1.5 1.2,2 ; 1.2,2.5 1.2,2 ; 1.7,-2 1.2,-2 ; 1.7,2 1.2,2 ; -1.8,-2.9 -1.8,-1.1 -0.6,-1.1 -0.6,-2.9 -1.8,-2.9 ; -1.8,1.1 -1.8,2.9 -0.6,2.9 -0.6,1.1 -1.8,1.1 ; 0.6,-2.9 1.8,-2.9 1.8,-1.1 0.6,-1.1 0.6,-2.9 ; 0.6,1.1 0.6,2.9 1.8,2.9 1.8,1.1 0.6,1.1
Mechanical 14:
  circle w0.1: c-0.925,1.825 r0.5
  lines w0.1: -1.65,2.25 -1.35,2.55 ; -1.65,2.25 -1.35,2.55 ; -1.65,2.25 -1.65,-2.25 -1.35,-2.55 1.35,-2.55 1.65,-2.25 1.65,2.25 1.35,2.55 -1.35,2.55
Mechanical 15:
  lines w0.05: -2.05,-3.15 -2.05,3.15 2.05,3.15 2.05,-3.15 -2.05,-3.15
3D body "XTAL_ABRACON_ABM3B.stp": height 1.1, standoff 0, extent -1.65,-2.55 1.65,2.55

## XTAL_ABRACON_ABM8-166 [mm] "4 Pins, SMD Crystal, Body 3.2x2.5mm, ABM8 Series"
height 0.75
pads (4):
  rect 0.9x1.2 smd: 1(-0.85,1.05) 2(-0.85,-1.05) 3(0.85,-1.05) 4(0.85,1.05)
Top Overlay:
  circle w0.25: c-1.854,1.016 r0.125
  lines w0.2: -1.3,-0.1 -1.3,0.1 ; -0.05,-1.65 0.05,-1.65 ; -0.05,1.65 0.05,1.65 ; 1.3,-0.1 1.3,0.1
Mechanical 8:
  lines w0.05: -1.35,-1.05 -0.85,-1.05 ; -1.35,1.05 -0.85,1.05 ; -0.85,-1.55 -0.85,-1.05 ; -0.85,-0.55 -0.85,-1.05 ; -0.85,0.55 -0.85,1.05 ; -0.85,1.55 -0.85,1.05 ; -0.5,0 0,0 ; -0.35,-1.05 -0.85,-1.05 ; -0.35,1.05 -0.85,1.05 ; 0,-0.5 0,0 ; 0,0.5 0,0 ; 0.35,-1.05 0.85,-1.05 ; 0.35,1.05 0.85,1.05 ; 0.5,0 0,0 ; 0.85,-1.55 0.85,-1.05 ; 0.85,-0.55 0.85,-1.05 ; 0.85,0.55 0.85,1.05 ; 0.85,1.55 0.85,1.05 ; 1.35,-1.05 0.85,-1.05 ; 1.35,1.05 0.85,1.05 ; -1.3,-1.65 -0.4,-1.65 -0.4,-0.45 -1.3,-0.45 -1.3,-1.65 ; -1.3,0.45 -0.4,0.45 -0.4,1.65 -1.3,1.65 -1.3,0.45 ; 0.4,-1.65 1.3,-1.65 1.3,-0.45 0.4,-0.45 0.4,-1.65 ; 0.4,0.45 1.3,0.45 1.3,1.65 0.4,1.65 0.4,0.45
Mechanical 14:
  lines w0.1: -1.3,-1.65 -1.3,1.65 1.3,1.65 1.3,-1.65 -1.3,-1.65
Mechanical 15:
  lines w0.05: -1.55,-1.9 -1.55,1.9 1.55,1.9 1.55,-1.9 -1.55,-1.9
3D body "XTAL_ABRACON_ABM8-166.stp": height 0.75, standoff 0, extent -1.244,-1.6 1.245,1.6

## XTAL_ABRACON_ABMM2 [mm] "4 Pins,  6mm L X 3.5mm H, SMD Low Profile Crystal, ABMM2 Serie"
height 1.2
pads (4):
  rect 1.4x1.8 smd: 1(-1.2,2.2) 2(-1.2,-2.2) 3(1.2,-2.2) 4(1.2,2.2)
Top Overlay:
  circle w0.25: c-2.5,2.6 r0.125
  lines w0.2: -1.95,-0.95 -1.95,0.95 ; -0.15,-3.1 0.15,-3.1 ; -0.15,3.1 0.15,3.1 ; 1.95,-0.95 1.95,0.95
Mechanical 8:
  lines w0.05: -1.7,-2.2 -1.2,-2.2 ; -1.7,2.2 -1.2,2.2 ; -1.2,-2.7 -1.2,-2.2 ; -1.2,-1.7 -1.2,-2.2 ; -1.2,1.7 -1.2,2.2 ; -1.2,2.7 -1.2,2.2 ; -0.7,-2.2 -1.2,-2.2 ; -0.7,2.2 -1.2,2.2 ; -0.5,0 0,0 ; 0,-0.5 0,0 ; 0,0.5 0,0 ; 0.5,0 0,0 ; 0.7,-2.2 1.2,-2.2 ; 0.7,2.2 1.2,2.2 ; 1.2,-2.7 1.2,-2.2 ; 1.2,-1.7 1.2,-2.2 ; 1.2,1.7 1.2,2.2 ; 1.2,2.7 1.2,2.2 ; 1.7,-2.2 1.2,-2.2 ; 1.7,2.2 1.2,2.2 ; -1.9,-3.1 -1.9,-1.3 -0.5,-1.3 -0.5,-3.1 -1.9,-3.1 ; -1.9,1.3 -1.9,3.1 -0.5,3.1 -0.5,1.3 -1.9,1.3 ; 0.5,-3.1 1.9,-3.1 1.9,-1.3 0.5,-1.3 0.5,-3.1 ; 0.5,1.3 1.9,1.3 1.9,3.1 0.5,3.1 0.5,1.3
Mechanical 14:
  lines w0.1: -1.95,-2.8 -1.95,2.8 -1.65,3.1 1.65,3.1 1.95,2.8 1.95,-2.8 1.65,-3.1 -1.65,-3.1 -1.95,-2.8
Mechanical 15:
  lines w0.05: -2.2,-3.35 2.2,-3.35 2.2,3.35 -2.2,3.35 -2.2,-3.35
3D body "XTAL_ABRACON_ABMM2.stp": height 1.2, standoff 0, extent -1.95,-3.1 1.95,3.1

## XTAL_ABRACON_ABS06 [mm] "2 Pins, 2.15x1.3mm, SMD Low Profile Crystal, ABS06 Series"
height 0.6
pads (2):
  rect 0.75x1.4 smd: 1(-0.725,0) 2(0.725,0)
Top Overlay:
  lines w0.2: 0,-0.65 0,0.65
Mechanical 8:
  lines w0.05: -1.1,0 -0.725,0 ; -0.725,-0.7 -0.725,0 ; -0.725,0.7 -0.725,0 ; 0,-0.5 0,0 ; 0,0.5 0,0 ; 0.725,-0.7 0.725,0 ; 0.725,0.7 0.725,0 ; 1.1,0 0.725,0 ; -0.725,0 -0.35,0 0,0 ; 0,0 0.35,0 0.725,0 ; -1.1,-0.7 -0.35,-0.7 -0.35,0.7 -1.1,0.7 -1.1,-0.7 ; 0.35,-0.7 1.1,-0.7 1.1,0.7 0.35,0.7 0.35,-0.7
Mechanical 14:
  lines w0.1: -1.075,-0.55 cw(c-1.075,-0.65) -0.975,-0.65 0.975,-0.65 cw(c1.075,-0.65) 1.075,-0.55 1.075,0.55 cw(c1.075,0.65) 0.975,0.65 -0.975,0.65 cw(c-1.075,0.65) -1.075,0.55 -1.075,-0.55 ; -0.9,-0.4 ccw(c-0.8,-0.4) -0.8,-0.5 0.8,-0.5 ccw(c0.8,-0.4) 0.9,-0.4 0.9,0.4 ccw(c0.8,0.4) 0.8,0.5 -0.8,0.5 ccw(c-0.8,0.4) -0.9,0.4 -0.9,-0.4
Mechanical 15:
  lines w0.05: -1.35,-0.95 1.35,-0.95 1.35,0.95 -1.35,0.95 -1.35,-0.95
3D body "XTAL_ABRACON_ABS06.stp": height 0.6, standoff 0, extent -1.075,-0.65 1.075,0.65